# Altium schematic symbol library Regulator_Linear.SchLib: 1538 symbols (part 8 of 9) (continued)
## TLV75533PDBV
designator *  value TLV75533PDBV  Reference: U
ki_keywords: LDO Regulator Fixed Positive; ki_description: 500mA Low Dropout Voltage Regulator, Fixed Output 3.3V, SOT-23-5; ki_fp_filters: SOT?23*; Footprint: Package_TO_SOT_SMD:SOT-23-5; Datasheet: http://www.ti.com/lit/ds/symlink/tlv755p.pdf
pins: 1 IN, 2 GND, 3 EN, 4 NC hidden, 5 OUT

## TLV75533PDRV
designator *  value TLV75533PDRV  Reference: U
ki_keywords: LDO Regulator Fixed Positive; ki_description: 500mA Low Dropout Voltage Regulator, Fixed Output 3.3V, WSON6; ki_fp_filters: WSON*1EP*2x2mm*P0.65mm*; Footprint: Package_SON:WSON-6-1EP_2x2mm_P0.65mm_EP1x1.6mm; Datasheet: http://www.ti.com/lit/ds/symlink/tlv755p.pdf
pins: 1 OUT, 2 NC hidden, 3 GND, 4 EN, 5 NC hidden, 6 IN, 7 GND hidden

## TLV75709PDBV
designator *  value TLV75709PDBV  Reference: U
ki_keywords: LDO Regulator Fixed Positive; ki_description: 1A Low IQ Small Size Low Dropout Voltage Regulator, Fixed Output 0.9V, SOT-23-5; ki_fp_filters: SOT?23*; Footprint: Package_TO_SOT_SMD:SOT-23-5; Datasheet: https://www.ti.com/lit/ds/symlink/tlv757p.pdf
pins: 1 IN, 2 GND, 3 EN, 4 NC hidden, 5 OUT

## TLV75709PDRV
designator *  value TLV75709PDRV  Reference: U
ki_keywords: LDO Regulator Fixed Positive; ki_description: 1A Low IQ Small Size Low Dropout Voltage Regulator, Fixed Output 0.9V, WSON6; ki_fp_filters: WSON*1EP*2x2mm*P0.65mm*; Footprint: Package_SON:WSON-6-1EP_2x2mm_P0.65mm_EP1x1.6mm; Datasheet: https://www.ti.com/lit/ds/symlink/tlv757p.pdf
pins: 1 OUT, 2 NC hidden, 3 GND, 4 EN, 5 NC hidden, 6 IN, 7 GND hidden

## TLV75710PDBV
designator *  value TLV75710PDBV  Reference: U
ki_keywords: LDO Regulator Fixed Positive; ki_description: 1A Low IQ Small Size Low Dropout Voltage Regulator, Fixed Output 1.0V, SOT-23-5; ki_fp_filters: SOT?23*; Footprint: Package_TO_SOT_SMD:SOT-23-5; Datasheet: https://www.ti.com/lit/ds/symlink/tlv757p.pdf
pins: 1 IN, 2 GND, 3 EN, 4 NC hidden, 5 OUT

## TLV75710PDRV
designator *  value TLV75710PDRV  Reference: U
ki_keywords: LDO Regulator Fixed Positive; ki_description: 1A Low IQ Small Size Low Dropout Voltage Regulator, Fixed Output 1.0V, WSON6; ki_fp_filters: WSON*1EP*2x2mm*P0.65mm*; Footprint: Package_SON:WSON-6-1EP_2x2mm_P0.65mm_EP1x1.6mm; Datasheet: https://www.ti.com/lit/ds/symlink/tlv757p.pdf
pins: 1 OUT, 2 NC hidden, 3 GND, 4 EN, 5 NC hidden, 6 IN, 7 GND hidden

## TLV75712PDBV
designator *  value TLV75712PDBV  Reference: U
ki_keywords: LDO Regulator Fixed Positive; ki_description: 1A Low IQ Small Size Low Dropout Voltage Regulator, Fixed Output 1.2V, SOT-23-5; ki_fp_filters: SOT?23*; Footprint: Package_TO_SOT_SMD:SOT-23-5; Datasheet: https://www.ti.com/lit/ds/symlink/tlv757p.pdf
pins: 1 IN, 2 GND, 3 EN, 4 NC hidden, 5 OUT

## TLV75712PDRV
designator *  value TLV75712PDRV  Reference: U
ki_keywords: LDO Regulator Fixed Positive; ki_description: 1A Low IQ Small Size Low Dropout Voltage Regulator, Fixed Output 1.2V, WSON6; ki_fp_filters: WSON*1EP*2x2mm*P0.65mm*; Footprint: Package_SON:WSON-6-1EP_2x2mm_P0.65mm_EP1x1.6mm; Datasheet: https://www.ti.com/lit/ds/symlink/tlv757p.pdf
pins: 1 OUT, 2 NC hidden, 3 GND, 4 EN, 5 NC hidden, 6 IN, 7 GND hidden

## TLV75715PDBV
designator *  value TLV75715PDBV  Reference: U
ki_keywords: LDO Regulator Fixed Positive; ki_description: 1A Low IQ Small Size Low Dropout Voltage Regulator, Fixed Output 1.5V, SOT-23-5; ki_fp_filters: SOT?23*; Footprint: Package_TO_SOT_SMD:SOT-23-5; Datasheet: https://www.ti.com/lit/ds/symlink/tlv757p.pdf
pins: 1 IN, 2 GND, 3 EN, 4 NC hidden, 5 OUT

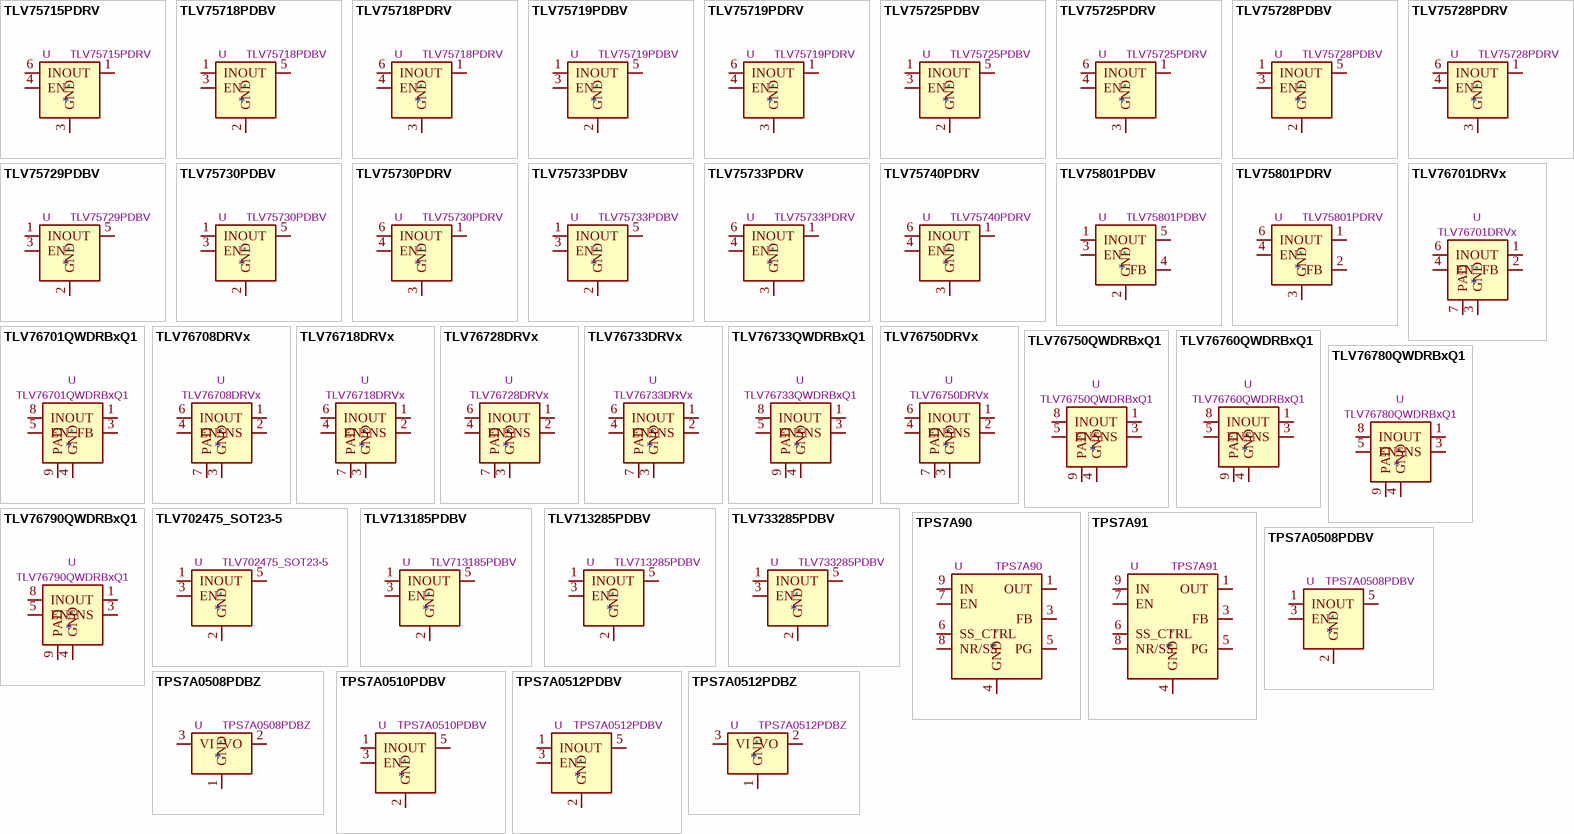
[diagram p34: symbols TLV75715PDRV to TPS7A0512PDBZ]

## TLV75715PDRV
designator *  value TLV75715PDRV  Reference: U
ki_keywords: LDO Regulator Fixed Positive; ki_description: 1A Low IQ Small Size Low Dropout Voltage Regulator, Fixed Output 1.5V, WSON6; ki_fp_filters: WSON*1EP*2x2mm*P0.65mm*; Footprint: Package_SON:WSON-6-1EP_2x2mm_P0.65mm_EP1x1.6mm; Datasheet: https://www.ti.com/lit/ds/symlink/tlv757p.pdf
pins: 1 OUT, 2 NC hidden, 3 GND, 4 EN, 5 NC hidden, 6 IN, 7 GND hidden

## TLV75718PDBV
designator *  value TLV75718PDBV  Reference: U
ki_keywords: LDO Regulator Fixed Positive; ki_description: 1A Low IQ Small Size Low Dropout Voltage Regulator, Fixed Output 1.8V, SOT-23-5; ki_fp_filters: SOT?23*; Footprint: Package_TO_SOT_SMD:SOT-23-5; Datasheet: https://www.ti.com/lit/ds/symlink/tlv757p.pdf
pins: 1 IN, 2 GND, 3 EN, 4 NC hidden, 5 OUT

## TLV75718PDRV
designator *  value TLV75718PDRV  Reference: U
ki_keywords: LDO Regulator Fixed Positive; ki_description: 1A Low IQ Small Size Low Dropout Voltage Regulator, Fixed Output 1.8V, WSON6; ki_fp_filters: WSON*1EP*2x2mm*P0.65mm*; Footprint: Package_SON:WSON-6-1EP_2x2mm_P0.65mm_EP1x1.6mm; Datasheet: https://www.ti.com/lit/ds/symlink/tlv757p.pdf
pins: 1 OUT, 2 NC hidden, 3 GND, 4 EN, 5 NC hidden, 6 IN, 7 GND hidden

## TLV75719PDBV
designator *  value TLV75719PDBV  Reference: U
ki_keywords: LDO Regulator Fixed Positive; ki_description: 1A Low IQ Small Size Low Dropout Voltage Regulator, Fixed Output 1.9V, SOT-23-5; ki_fp_filters: SOT?23*; Footprint: Package_TO_SOT_SMD:SOT-23-5; Datasheet: https://www.ti.com/lit/ds/symlink/tlv757p.pdf
pins: 1 IN, 2 GND, 3 EN, 4 NC hidden, 5 OUT

## TLV75719PDRV
designator *  value TLV75719PDRV  Reference: U
ki_keywords: LDO Regulator Fixed Positive; ki_description: 1A Low IQ Small Size Low Dropout Voltage Regulator, Fixed Output 1.9V, WSON6; ki_fp_filters: WSON*1EP*2x2mm*P0.65mm*; Footprint: Package_SON:WSON-6-1EP_2x2mm_P0.65mm_EP1x1.6mm; Datasheet: https://www.ti.com/lit/ds/symlink/tlv757p.pdf
pins: 1 OUT, 2 NC hidden, 3 GND, 4 EN, 5 NC hidden, 6 IN, 7 GND hidden

## TLV75725PDBV
designator *  value TLV75725PDBV  Reference: U
ki_keywords: LDO Regulator Fixed Positive; ki_description: 1A Low IQ Small Size Low Dropout Voltage Regulator, Fixed Output 2.5V, SOT-23-5; ki_fp_filters: SOT?23*; Footprint: Package_TO_SOT_SMD:SOT-23-5; Datasheet: https://www.ti.com/lit/ds/symlink/tlv757p.pdf
pins: 1 IN, 2 GND, 3 EN, 4 NC hidden, 5 OUT

## TLV75725PDRV
designator *  value TLV75725PDRV  Reference: U
ki_keywords: LDO Regulator Fixed Positive; ki_description: 1A Low IQ Small Size Low Dropout Voltage Regulator, Fixed Output 2.5V, WSON6; ki_fp_filters: WSON*1EP*2x2mm*P0.65mm*; Footprint: Package_SON:WSON-6-1EP_2x2mm_P0.65mm_EP1x1.6mm; Datasheet: https://www.ti.com/lit/ds/symlink/tlv757p.pdf
pins: 1 OUT, 2 NC hidden, 3 GND, 4 EN, 5 NC hidden, 6 IN, 7 GND hidden

## TLV75728PDBV
designator *  value TLV75728PDBV  Reference: U
ki_keywords: LDO Regulator Fixed Positive; ki_description: 1A Low IQ Small Size Low Dropout Voltage Regulator, Fixed Output 2.8V, SOT-23-5; ki_fp_filters: SOT?23*; Footprint: Package_TO_SOT_SMD:SOT-23-5; Datasheet: https://www.ti.com/lit/ds/symlink/tlv757p.pdf
pins: 1 IN, 2 GND, 3 EN, 4 NC hidden, 5 OUT

## TLV75728PDRV
designator *  value TLV75728PDRV  Reference: U
ki_keywords: LDO Regulator Fixed Positive; ki_description: 1A Low IQ Small Size Low Dropout Voltage Regulator, Fixed Output 2.8V, WSON6; ki_fp_filters: WSON*1EP*2x2mm*P0.65mm*; Footprint: Package_SON:WSON-6-1EP_2x2mm_P0.65mm_EP1x1.6mm; Datasheet: https://www.ti.com/lit/ds/symlink/tlv757p.pdf
pins: 1 OUT, 2 NC hidden, 3 GND, 4 EN, 5 NC hidden, 6 IN, 7 GND hidden

## TLV75729PDBV
designator *  value TLV75729PDBV  Reference: U
ki_keywords: LDO Regulator Fixed Positive; ki_description: 1A Low IQ Small Size Low Dropout Voltage Regulator, Fixed Output 2.9V, SOT-23-5; ki_fp_filters: SOT?23*; Footprint: Package_TO_SOT_SMD:SOT-23-5; Datasheet: https://www.ti.com/lit/ds/symlink/tlv757p.pdf
pins: 1 IN, 2 GND, 3 EN, 4 NC hidden, 5 OUT

## TLV75730PDBV
designator *  value TLV75730PDBV  Reference: U
ki_keywords: LDO Regulator Fixed Positive; ki_description: 1A Low IQ Small Size Low Dropout Voltage Regulator, Fixed Output 3.0V, SOT-23-5; ki_fp_filters: SOT?23*; Footprint: Package_TO_SOT_SMD:SOT-23-5; Datasheet: https://www.ti.com/lit/ds/symlink/tlv757p.pdf
pins: 1 IN, 2 GND, 3 EN, 4 NC hidden, 5 OUT

## TLV75730PDRV
designator *  value TLV75730PDRV  Reference: U
ki_keywords: LDO Regulator Fixed Positive; ki_description: 1A Low IQ Small Size Low Dropout Voltage Regulator, Fixed Output 3.0V, WSON6; ki_fp_filters: WSON*1EP*2x2mm*P0.65mm*; Footprint: Package_SON:WSON-6-1EP_2x2mm_P0.65mm_EP1x1.6mm; Datasheet: https://www.ti.com/lit/ds/symlink/tlv757p.pdf
pins: 1 OUT, 2 NC hidden, 3 GND, 4 EN, 5 NC hidden, 6 IN, 7 GND hidden

## TLV75733PDBV
designator *  value TLV75733PDBV  Reference: U
ki_keywords: LDO Regulator Fixed Positive; ki_description: 1A Low IQ Small Size Low Dropout Voltage Regulator, Fixed Output 3.3V, SOT-23-5; ki_fp_filters: SOT?23*; Footprint: Package_TO_SOT_SMD:SOT-23-5; Datasheet: https://www.ti.com/lit/ds/symlink/tlv757p.pdf
pins: 1 IN, 2 GND, 3 EN, 4 NC hidden, 5 OUT

## TLV75733PDRV
designator *  value TLV75733PDRV  Reference: U
ki_keywords: LDO Regulator Fixed Positive; ki_description: 1A Low IQ Small Size Low Dropout Voltage Regulator, Fixed Output 3.3V, WSON6; ki_fp_filters: WSON*1EP*2x2mm*P0.65mm*; Footprint: Package_SON:WSON-6-1EP_2x2mm_P0.65mm_EP1x1.6mm; Datasheet: https://www.ti.com/lit/ds/symlink/tlv757p.pdf
pins: 1 OUT, 2 NC hidden, 3 GND, 4 EN, 5 NC hidden, 6 IN, 7 GND hidden

## TLV75740PDRV
designator *  value TLV75740PDRV  Reference: U
ki_keywords: LDO Regulator Fixed Positive; ki_description: 1A Low IQ Small Size Low Dropout Voltage Regulator, Fixed Output 4.0V, WSON6; ki_fp_filters: WSON*1EP*2x2mm*P0.65mm*; Footprint: Package_SON:WSON-6-1EP_2x2mm_P0.65mm_EP1x1.6mm; Datasheet: https://www.ti.com/lit/ds/symlink/tlv757p.pdf
pins: 1 OUT, 2 NC hidden, 3 GND, 4 EN, 5 NC hidden, 6 IN, 7 GND hidden

## TLV75801PDBV
designator *  value TLV75801PDBV  Reference: U
ki_keywords: ldo positive; ki_description: 500mA Low-Dropout Linear Regulator, Adjustable Output, SOT-23-5; ki_fp_filters: SOT?23*; Footprint: Package_TO_SOT_SMD:SOT-23-5; Datasheet: https://www.ti.com/lit/ds/symlink/tlv758p.pdf
pins: 1 IN, 2 GND, 3 EN, 4 FB, 5 OUT

## TLV75801PDRV
designator *  value TLV75801PDRV  Reference: U
ki_keywords: ldo positive; ki_description: 500mA Low-Dropout Linear Regulator, Adjustable Output, WSON-6; ki_fp_filters: WSON*1EP*2x2mm*P0.65mm*; Footprint: Package_SON:WSON-6-1EP_2x2mm_P0.65mm_EP1x1.6mm; Datasheet: https://www.ti.com/lit/ds/symlink/tlv758p.pdf
pins: 1 OUT, 2 FB, 3 GND, 4 EN, 5 DNC hidden, 6 IN, 7 GND hidden

## TLV76701DRVx
designator *  value TLV76701DRVx  Reference: U
ki_keywords: 1A, 16V Precision Linear Voltage Regulator; ki_description: 1A, 16V Precision Linear Voltage Regulator, with enable pin, Adjustable Output 0.8-13.6V, WSON-6; ki_fp_filters: WSON*1EP*2x2mm*P0.65*; Footprint: Package_SON:WSON-6-1EP_2x2mm_P0.65mm_EP1x1.6mm_ThermalVias; Datasheet: www.ti.com/lit/gpn/TLV767
pins: 1 OUT, 2 FB, 3 GND, 4 EN, 5 GND hidden, 6 IN, 7 PAD

## TLV76701QWDRBxQ1
designator *  value TLV76701QWDRBxQ1  Reference: U
ki_keywords: 1A 16V Precision Linear Voltage Regulator; ki_description: 1A, 16V Precision Linear Voltage Regulator, with enable pin, Adjustable Output 0.8-14.6V, VSON-8; ki_fp_filters: VSON*1EP*3x3mm*P0.65mm*; Footprint: Package_SON:VSON-8-1EP_3x3mm_P0.65mm_EP1.65x2.4mm; Datasheet: www.ti.com/lit/gpn/TLV767-q1
pins: 1 OUT, 2 NC hidden, 3 FB, 4 GND, 5 EN, 6 GND hidden, 7 NC hidden, 8 IN, 9 PAD

## TLV76708DRVx
designator *  value TLV76708DRVx  Reference: U
ki_keywords: 1A Precision Linear Voltage Regulator; ki_description: 1A Precision Linear Voltage Regulator, with enable pin, Fixed Output 0.8V, WSON6; ki_fp_filters: WSON*1EP*2x2mm*P0.65*; Footprint: Package_SON:WSON-6-1EP_2x2mm_P0.65mm_EP1x1.6mm_ThermalVias; Datasheet: www.ti.com/lit/gpn/TLV767
pins: 1 OUT, 2 SNS, 3 GND, 4 EN, 5 GND hidden, 6 IN, 7 PAD

## TLV76718DRVx
designator *  value TLV76718DRVx  Reference: U
ki_keywords: 1A Precision Linear Voltage Regulator; ki_description: 1A Precision Linear Voltage Regulator, with enable pin, Fixed Output 1.8V, WSON6; ki_fp_filters: WSON*1EP*2x2mm*P0.65*; Footprint: Package_SON:WSON-6-1EP_2x2mm_P0.65mm_EP1x1.6mm_ThermalVias; Datasheet: www.ti.com/lit/gpn/TLV767
pins: 1 OUT, 2 SNS, 3 GND, 4 EN, 5 GND hidden, 6 IN, 7 PAD

## TLV76728DRVx
designator *  value TLV76728DRVx  Reference: U
ki_keywords: 1A Precision Linear Voltage Regulator; ki_description: 1A Precision Linear Voltage Regulator, with enable pin, Fixed Output 2.8V, WSON6; ki_fp_filters: WSON*1EP*2x2mm*P0.65*; Footprint: Package_SON:WSON-6-1EP_2x2mm_P0.65mm_EP1x1.6mm_ThermalVias; Datasheet: www.ti.com/lit/gpn/TLV767
pins: 1 OUT, 2 SNS, 3 GND, 4 EN, 5 GND hidden, 6 IN, 7 PAD

## TLV76733DRVx
designator *  value TLV76733DRVx  Reference: U
ki_keywords: 1A Precision Linear Voltage Regulator; ki_description: 1A Precision Linear Voltage Regulator, with enable pin, Fixed Output 3.3V, WSON6; ki_fp_filters: WSON*1EP*2x2mm*P0.65*; Footprint: Package_SON:WSON-6-1EP_2x2mm_P0.65mm_EP1x1.6mm_ThermalVias; Datasheet: www.ti.com/lit/gpn/TLV767
pins: 1 OUT, 2 SNS, 3 GND, 4 EN, 5 GND hidden, 6 IN, 7 PAD

## TLV76733QWDRBxQ1
designator *  value TLV76733QWDRBxQ1  Reference: U
ki_keywords: 1A 16V Precision Linear Voltage Regulator; ki_description: 1A, 16V Precision Linear Voltage Regulator, with enable pin, Fixed Output 3.3V, VSON-8; ki_fp_filters: VSON*1EP*3x3mm*P0.65mm*; Footprint: Package_SON:VSON-8-1EP_3x3mm_P0.65mm_EP1.65x2.4mm; Datasheet: www.ti.com/lit/gpn/TLV767-q1
pins: 1 OUT, 2 NC hidden, 3 SNS, 4 GND, 5 EN, 6 GND hidden, 7 NC hidden, 8 IN, 9 PAD

## TLV76750DRVx
designator *  value TLV76750DRVx  Reference: U
ki_keywords: 1A, 16V Precision Linear Voltage Regulator; ki_description: 1A, 16V Precision Linear Voltage Regulator, with enable pin, Fixed Output 5.0V, WSON-6; ki_fp_filters: WSON*1EP*2x2mm*P0.65*; Footprint: Package_SON:WSON-6-1EP_2x2mm_P0.65mm_EP1x1.6mm_ThermalVias; Datasheet: www.ti.com/lit/gpn/TLV767
pins: 1 OUT, 2 SNS, 3 GND, 4 EN, 5 GND hidden, 6 IN, 7 PAD

## TLV76750QWDRBxQ1
designator *  value TLV76750QWDRBxQ1  Reference: U
ki_keywords: 1A 16V Precision Linear Voltage Regulator; ki_description: 1A, 16V Precision Linear Voltage Regulator, with enable pin, Fixed Output 5.0V, VSON-8; ki_fp_filters: VSON*1EP*3x3mm*P0.65mm*; Footprint: Package_SON:VSON-8-1EP_3x3mm_P0.65mm_EP1.65x2.4mm; Datasheet: www.ti.com/lit/gpn/TLV767-q1
pins: 1 OUT, 2 NC hidden, 3 SNS, 4 GND, 5 EN, 6 GND hidden, 7 NC hidden, 8 IN, 9 PAD

## TLV76760QWDRBxQ1
designator *  value TLV76760QWDRBxQ1  Reference: U
ki_keywords: 1A 16V Precision Linear Voltage Regulator; ki_description: 1A, 16V Precision Linear Voltage Regulator, with enable pin, Fixed Output 6.0V, VSON-8; ki_fp_filters: VSON*1EP*3x3mm*P0.65mm*; Footprint: Package_SON:VSON-8-1EP_3x3mm_P0.65mm_EP1.65x2.4mm; Datasheet: www.ti.com/lit/gpn/TLV767-q1
pins: 1 OUT, 2 NC hidden, 3 SNS, 4 GND, 5 EN, 6 GND hidden, 7 NC hidden, 8 IN, 9 PAD

## TLV76780QWDRBxQ1
designator *  value TLV76780QWDRBxQ1  Reference: U
ki_keywords: 1A 16V Precision Linear Voltage Regulator; ki_description: 1A, 16V Precision Linear Voltage Regulator, with enable pin, Fixed Output 8.0V, VSON-8; ki_fp_filters: VSON*1EP*3x3mm*P0.65mm*; Footprint: Package_SON:VSON-8-1EP_3x3mm_P0.65mm_EP1.65x2.4mm; Datasheet: www.ti.com/lit/gpn/TLV767-q1
pins: 1 OUT, 2 NC hidden, 3 SNS, 4 GND, 5 EN, 6 GND hidden, 7 NC hidden, 8 IN, 9 PAD

## TLV76790QWDRBxQ1
designator *  value TLV76790QWDRBxQ1  Reference: U
ki_keywords: 1A 16V Precision Linear Voltage Regulator; ki_description: 1A, 16V Precision Linear Voltage Regulator, with enable pin, Fixed Output 9.0V, VSON-8; ki_fp_filters: VSON*1EP*3x3mm*P0.65mm*; Footprint: Package_SON:VSON-8-1EP_3x3mm_P0.65mm_EP1.65x2.4mm; Datasheet: www.ti.com/lit/gpn/TLV767-q1
pins: 1 OUT, 2 NC hidden, 3 SNS, 4 GND, 5 EN, 6 GND hidden, 7 NC hidden, 8 IN, 9 PAD

## TLV702475_SOT23-5
designator *  value TLV702475_SOT23-5  Reference: U
ki_keywords: 300mA LDO Regulator Fixed Positive; ki_description: 300mA Low Dropout Voltage Regulator, Fixed Output 4.75V, SOT-23-5; ki_fp_filters: SOT?23*; Footprint: Package_TO_SOT_SMD:SOT-23-5; Datasheet: http://www.ti.com/lit/ds/symlink/tlv702.pdf
pins: 1 IN, 2 GND, 3 EN, 4 NC hidden, 5 OUT

## TLV713185PDBV
designator *  value TLV713185PDBV  Reference: U
ki_keywords: LDO Regulator Fixed Positive; ki_description: 150mA Low Dropout Voltage Regulator, Fixed Output 1.8V, SOT-23-5; ki_fp_filters: SOT?23*; Footprint: Package_TO_SOT_SMD:SOT-23-5; Datasheet: http://www.ti.com/lit/ds/symlink/tlv713p.pdf
pins: 1 IN, 2 GND, 3 EN, 4 NC hidden, 5 OUT

## TLV713285PDBV
designator *  value TLV713285PDBV  Reference: U
ki_keywords: LDO Regulator Fixed Positive; ki_description: 150mA Low Dropout Voltage Regulator, Fixed Output 2.85V, SOT-23-5; ki_fp_filters: SOT?23*; Footprint: Package_TO_SOT_SMD:SOT-23-5; Datasheet: http://www.ti.com/lit/ds/symlink/tlv713p.pdf
pins: 1 IN, 2 GND, 3 EN, 4 NC hidden, 5 OUT

## TLV733285PDBV
designator *  value TLV733285PDBV  Reference: U
ki_keywords: 300mA LDO Regulator Fixed Positive Capacitor-Free; ki_description: 300mA Capacitor-Free Low Dropout Voltage Regulator, Fixed Output 2.85V, SOT-23-5; ki_fp_filters: SOT?23*; Footprint: Package_TO_SOT_SMD:SOT-23-5; Datasheet: http://www.ti.com/lit/ds/symlink/tlv733p.pdf
pins: 1 IN, 2 GND, 3 EN, 4 NC hidden, 5 OUT

## TPS7A90
designator *  value TPS7A90  Reference: U
ki_keywords: LDO voltage regulator; ki_description: 0.5A, High-Accuracy, Low-Noise LDO Voltage Regulator, Texas S-PDSO-N10; ki_fp_filters: Texas*S*PDSO*; Footprint: Package_DFN_QFN:Texas_S-PDSO-N10_EP1.2x2mm; Datasheet: http://www.ti.com/lit/ds/symlink/tps7a90.pdf
pins: 1 OUT, 2 OUT hidden, 3 FB, 4 GND, 5 PG, 6 SS_CTRL, 7 EN, 8 NR/SS, 9 IN, 10 IN hidden, 11 GND hidden

## TPS7A91
designator *  value TPS7A91  Reference: U
ki_keywords: LDO voltage regulator; ki_description: 1A, High-Accuracy, Low-Noise LDO Voltage Regulator, Texas S-PDSO-N10; ki_fp_filters: Texas*S*PDSO*; Footprint: Package_DFN_QFN:Texas_S-PDSO-N10_EP1.2x2mm; Datasheet: http://www.ti.com/lit/ds/symlink/tps7a91.pdf
pins: 1 OUT, 2 OUT hidden, 3 FB, 4 GND, 5 PG, 6 SS_CTRL, 7 EN, 8 NR/SS, 9 IN, 10 IN hidden, 11 GND hidden

## TPS7A0508PDBV
designator *  value TPS7A0508PDBV  Reference: U
ki_keywords: Single Output LDO Low-Iq; ki_description: 200-mA Ultra-Low-Iq LDO, 0.8V, SOT-23-5; ki_fp_filters: SOT?23*; Footprint: Package_TO_SOT_SMD:SOT-23-5; Datasheet: https://www.ti.com/lit/ds/symlink/tps7a05.pdf
pins: 1 IN, 2 GND, 3 EN, 4 NC hidden, 5 OUT

## TPS7A0508PDBZ
designator *  value TPS7A0508PDBZ  Reference: U
ki_keywords: Single Output LDO Low-Iq; ki_description: 200-mA Ultra-Low-Iq LDO, 0.8V, SOT-23-3; ki_fp_filters: SOT?23*; Footprint: Package_TO_SOT_SMD:SOT-23; Datasheet: https://www.ti.com/lit/ds/symlink/tps7a05.pdf
pins: 1 GND, 2 VO, 3 VI

## TPS7A0510PDBV
designator *  value TPS7A0510PDBV  Reference: U
ki_keywords: Single Output LDO Low-Iq; ki_description: 200-mA Ultra-Low-Iq LDO, 1.0V, SOT-23-5; ki_fp_filters: SOT?23*; Footprint: Package_TO_SOT_SMD:SOT-23-5; Datasheet: https://www.ti.com/lit/ds/symlink/tps7a05.pdf
pins: 1 IN, 2 GND, 3 EN, 4 NC hidden, 5 OUT

## TPS7A0512PDBV
designator *  value TPS7A0512PDBV  Reference: U
ki_keywords: Single Output LDO Low-Iq; ki_description: 200-mA Ultra-Low-Iq LDO, 1.2V, SOT-23-5; ki_fp_filters: SOT?23*; Footprint: Package_TO_SOT_SMD:SOT-23-5; Datasheet: https://www.ti.com/lit/ds/symlink/tps7a05.pdf
pins: 1 IN, 2 GND, 3 EN, 4 NC hidden, 5 OUT

## TPS7A0512PDBZ
designator *  value TPS7A0512PDBZ  Reference: U
ki_keywords: Single Output LDO Low-Iq; ki_description: 200-mA Ultra-Low-Iq LDO, 1.2V, SOT-23-3; ki_fp_filters: SOT?23*; Footprint: Package_TO_SOT_SMD:SOT-23; Datasheet: https://www.ti.com/lit/ds/symlink/tps7a05.pdf
pins: 1 GND, 2 VO, 3 VI

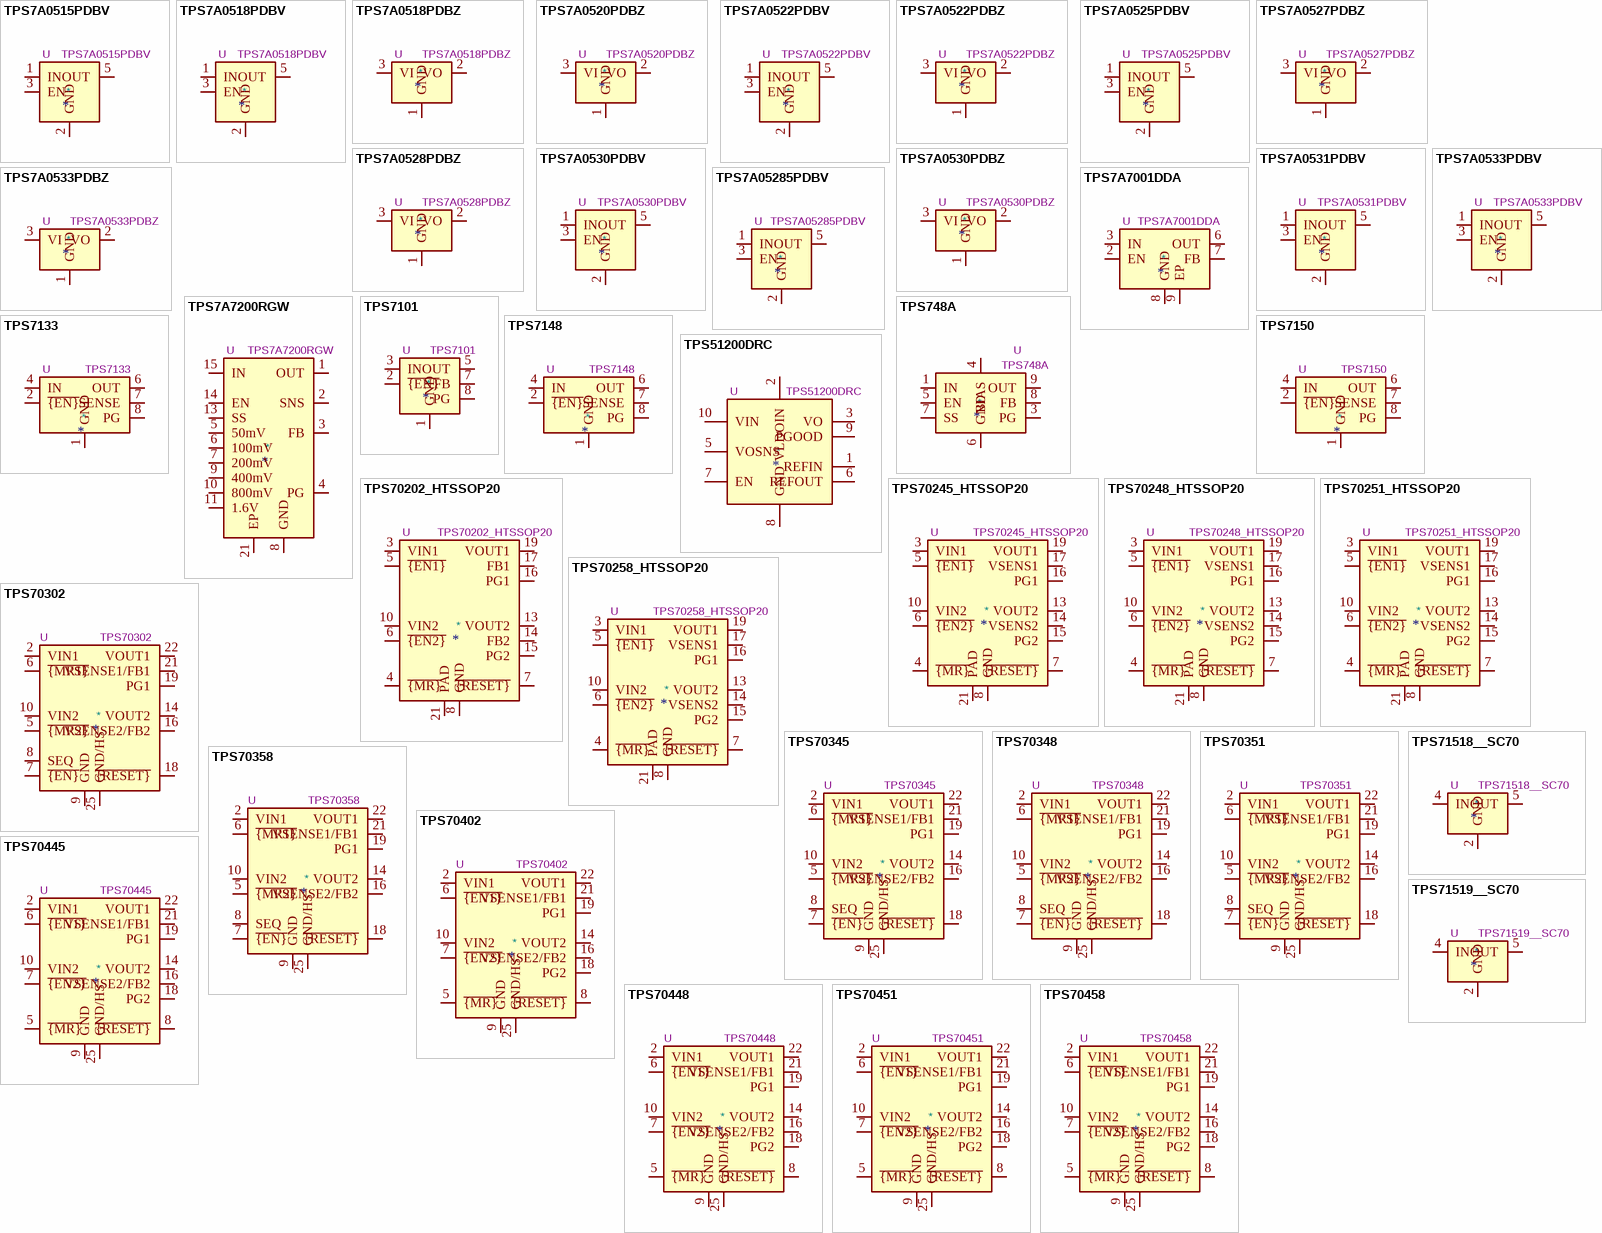
[diagram p35: symbols TPS7A0515PDBV to TPS71519__SC70]

## TPS7A0515PDBV
designator *  value TPS7A0515PDBV  Reference: U
ki_keywords: Single Output LDO Low-Iq; ki_description: 200-mA Ultra-Low-Iq LDO, 1.5V, SOT-23-5; ki_fp_filters: SOT?23*; Footprint: Package_TO_SOT_SMD:SOT-23-5; Datasheet: https://www.ti.com/lit/ds/symlink/tps7a05.pdf
pins: 1 IN, 2 GND, 3 EN, 4 NC hidden, 5 OUT

## TPS7A0518PDBV
designator *  value TPS7A0518PDBV  Reference: U
ki_keywords: Single Output LDO Low-Iq; ki_description: 200-mA Ultra-Low-Iq LDO, 1.8V, SOT-23-5; ki_fp_filters: SOT?23*; Footprint: Package_TO_SOT_SMD:SOT-23-5; Datasheet: https://www.ti.com/lit/ds/symlink/tps7a05.pdf
pins: 1 IN, 2 GND, 3 EN, 4 NC hidden, 5 OUT

## TPS7A0518PDBZ
designator *  value TPS7A0518PDBZ  Reference: U
ki_keywords: Single Output LDO Low-Iq; ki_description: 200-mA Ultra-Low-Iq LDO, 1.8V, SOT-23-3; ki_fp_filters: SOT?23*; Footprint: Package_TO_SOT_SMD:SOT-23; Datasheet: https://www.ti.com/lit/ds/symlink/tps7a05.pdf
pins: 1 GND, 2 VO, 3 VI

## TPS7A0520PDBZ
designator *  value TPS7A0520PDBZ  Reference: U
ki_keywords: Single Output LDO Low-Iq; ki_description: 200-mA Ultra-Low-Iq LDO, 2.0V, SOT-23-3; ki_fp_filters: SOT?23*; Footprint: Package_TO_SOT_SMD:SOT-23; Datasheet: https://www.ti.com/lit/ds/symlink/tps7a05.pdf
pins: 1 GND, 2 VO, 3 VI

## TPS7A0522PDBV
designator *  value TPS7A0522PDBV  Reference: U
ki_keywords: Single Output LDO Low-Iq; ki_description: 200-mA Ultra-Low-Iq LDO, 2.2V, SOT-23-5; ki_fp_filters: SOT?23*; Footprint: Package_TO_SOT_SMD:SOT-23-5; Datasheet: https://www.ti.com/lit/ds/symlink/tps7a05.pdf
pins: 1 IN, 2 GND, 3 EN, 4 NC hidden, 5 OUT

## TPS7A0522PDBZ
designator *  value TPS7A0522PDBZ  Reference: U
ki_keywords: Single Output LDO Low-Iq; ki_description: 200-mA Ultra-Low-Iq LDO, 2.2V, SOT-23-3; ki_fp_filters: SOT?23*; Footprint: Package_TO_SOT_SMD:SOT-23; Datasheet: https://www.ti.com/lit/ds/symlink/tps7a05.pdf
pins: 1 GND, 2 VO, 3 VI

## TPS7A0525PDBV
designator *  value TPS7A0525PDBV  Reference: U
ki_keywords: Single Output LDO Low-Iq; ki_description: 200-mA Ultra-Low-Iq LDO, 2.5V, SOT-23-5; ki_fp_filters: SOT?23*; Footprint: Package_TO_SOT_SMD:SOT-23-5; Datasheet: https://www.ti.com/lit/ds/symlink/tps7a05.pdf
pins: 1 IN, 2 GND, 3 EN, 4 NC hidden, 5 OUT

## TPS7A0527PDBZ
designator *  value TPS7A0527PDBZ  Reference: U
ki_keywords: Single Output LDO Low-Iq; ki_description: 200-mA Ultra-Low-Iq LDO, 2.7V, SOT-23-3; ki_fp_filters: SOT?23*; Footprint: Package_TO_SOT_SMD:SOT-23; Datasheet: https://www.ti.com/lit/ds/symlink/tps7a05.pdf
pins: 1 GND, 2 VO, 3 VI

## TPS7A0528PDBZ
designator *  value TPS7A0528PDBZ  Reference: U
ki_keywords: Single Output LDO Low-Iq; ki_description: 200-mA Ultra-Low-Iq LDO, 2.8V, SOT-23-3; ki_fp_filters: SOT?23*; Footprint: Package_TO_SOT_SMD:SOT-23; Datasheet: https://www.ti.com/lit/ds/symlink/tps7a05.pdf
pins: 1 GND, 2 VO, 3 VI

## TPS7A0530PDBV
designator *  value TPS7A0530PDBV  Reference: U
ki_keywords: Single Output LDO Low-Iq; ki_description: 200-mA Ultra-Low-Iq LDO, 3.0V, SOT-23-5; ki_fp_filters: SOT?23*; Footprint: Package_TO_SOT_SMD:SOT-23-5; Datasheet: https://www.ti.com/lit/ds/symlink/tps7a05.pdf
pins: 1 IN, 2 GND, 3 EN, 4 NC hidden, 5 OUT

## TPS7A0530PDBZ
designator *  value TPS7A0530PDBZ  Reference: U
ki_keywords: Single Output LDO Low-Iq; ki_description: 200-mA Ultra-Low-Iq LDO, 3.0V, SOT-23-3; ki_fp_filters: SOT?23*; Footprint: Package_TO_SOT_SMD:SOT-23; Datasheet: https://www.ti.com/lit/ds/symlink/tps7a05.pdf
pins: 1 GND, 2 VO, 3 VI

## TPS7A0531PDBV
designator *  value TPS7A0531PDBV  Reference: U
ki_keywords: Single Output LDO Low-Iq; ki_description: 200-mA Ultra-Low-Iq LDO, 3.1V, SOT-23-5; ki_fp_filters: SOT?23*; Footprint: Package_TO_SOT_SMD:SOT-23-5; Datasheet: https://www.ti.com/lit/ds/symlink/tps7a05.pdf
pins: 1 IN, 2 GND, 3 EN, 4 NC hidden, 5 OUT

## TPS7A0533PDBV
designator *  value TPS7A0533PDBV  Reference: U
ki_keywords: Single Output LDO Low-Iq; ki_description: 200-mA Ultra-Low-Iq LDO, 3.3V, SOT-23-5; ki_fp_filters: SOT?23*; Footprint: Package_TO_SOT_SMD:SOT-23-5; Datasheet: https://www.ti.com/lit/ds/symlink/tps7a05.pdf
pins: 1 IN, 2 GND, 3 EN, 4 NC hidden, 5 OUT

## TPS7A0533PDBZ
designator *  value TPS7A0533PDBZ  Reference: U
ki_keywords: Single Output LDO Low-Iq; ki_description: 200-mA Ultra-Low-Iq LDO, 3.3V, SOT-23-3; ki_fp_filters: SOT?23*; Footprint: Package_TO_SOT_SMD:SOT-23; Datasheet: https://www.ti.com/lit/ds/symlink/tps7a05.pdf
pins: 1 GND, 2 VO, 3 VI

## TPS7A05285PDBV
designator *  value TPS7A05285PDBV  Reference: U
ki_keywords: Single Output LDO Low-Iq; ki_description: 200-mA Ultra-Low-Iq LDO, 2.85V, SOT-23-5; ki_fp_filters: SOT?23*; Footprint: Package_TO_SOT_SMD:SOT-23-5; Datasheet: https://www.ti.com/lit/ds/symlink/tps7a05.pdf
pins: 1 IN, 2 GND, 3 EN, 4 NC hidden, 5 OUT

## TPS7A7001DDA
designator *  value TPS7A7001DDA  Reference: U
ki_keywords: ldo regulator voltage linear; ki_description: 2A, Low-Dropout Voltage Regulator, 1.425-6.5V Input, Adjustable Min 0.5V Output, PowerPad SO-8; ki_fp_filters: TI*SO*PowerPAD*; Footprint: Package_SO:TI_SO-PowerPAD-8; Datasheet: http://www.ti.com/lit/ds/symlink/tps7a7001.pdf
pins: 1 NC hidden, 2 EN, 3 IN, 4 NC hidden, 5 NC hidden, 6 OUT, 7 FB, 8 GND, 9 EP

## TPS7A7200RGW
designator *  value TPS7A7200RGW  Reference: U
ki_keywords: linear regulator ldo voltage; ki_description: 2A, Low-Dropout Voltage Regulator, 1.5-6.5V Input, Adjustable 0.9-5V Output, VQFN-20; ki_fp_filters: Texas*S?PVQFN*; Footprint: Package_DFN_QFN:Texas_S-PVQFN-N20_EP3.15x3.15mm_ThermalVias; Datasheet: http://www.ti.com/lit/ds/symlink/tps7a7200.pdf
pins: 1 OUT, 2 SNS, 3 FB, 4 PG, 5 50mV, 6 100mV, 7 200mV, 8 GND, 9 400mV, 10 800mV, 11 1.6V, 12 NC hidden, 13 SS, 14 EN, 15 IN, 16 IN hidden, 17 IN hidden, 18 GND hidden, 19 OUT hidden, 20 OUT hidden, 21 EP

## TPS748A
designator *  value TPS748A  Reference: U
ki_keywords: regulator LDO positive adjustable; ki_description: Texas Instruments 1.5A, Low-Dropout Linear Regulator With Programmable Soft-Start, 0.8-6.0Vin, 2.7-6.0Vbias, 0.8-3.6Vout; ki_fp_filters: VSON*EP*3x3mm*P0.5mm*; Footprint: Package_SON:VSON-10-1EP_3x3mm_P0.5mm_EP1.65x2.4mm_ThermalVias; Datasheet: https://www.ti.com/lit/ds/symlink/tps748a.pdf
pins: 1 IN, 2 IN hidden, 3 PG, 4 BIAS, 5 EN, 6 GND, 7 SS, 8 FB, 9 OUT, 10 OUT hidden, 11 GND hidden

## TPS7101
designator *  value TPS7101  Reference: U
ki_keywords: LDO Voltage Regulator 500mA Adjustable; ki_description: 500mA Adjustable 1.2-9.75V Low Drop-out Voltage Regulator, SO-8/DIP-8; ki_fp_filters: SOIC*3.9x4.9mm*P1.27mm* DIP*W7.62mm*; Datasheet: http://www.ti.com/lit/ds/symlink/tps71.pdf
pins: 1 GND, 2 ~{{EN}}, 3 IN, 4 IN hidden, 5 OUT, 6 OUT hidden, 7 FB, 8 PG

## TPS7133
designator *  value TPS7133  Reference: U
ki_keywords: LDO Voltage Regulator 500mA; ki_description: 500mA Low Drop-out Voltage Regulator, Fixed Output 3.3V, SO-8/DIP-8; ki_fp_filters: SOIC*3.9x4.9mm*P1.27mm* DIP*W7.62mm*; Datasheet: http://www.ti.com/lit/ds/symlink/tps71.pdf
pins: 1 GND, 2 ~{{EN}}, 3 IN hidden, 4 IN, 5 OUT hidden, 6 OUT, 7 SENSE, 8 PG

## TPS7148
designator *  value TPS7148  Reference: U
ki_keywords: LDO Voltage Regulator 500mA; ki_description: 500mA Low Drop-out Voltage Regulator, Fixed Output 4.85V, SO-8/DIP-8; ki_fp_filters: SOIC*3.9x4.9mm*P1.27mm* DIP*W7.62mm*; Datasheet: http://www.ti.com/lit/ds/symlink/tps71.pdf
pins: 1 GND, 2 ~{{EN}}, 3 IN hidden, 4 IN, 5 OUT hidden, 6 OUT, 7 SENSE, 8 PG

## TPS7150
designator *  value TPS7150  Reference: U
ki_keywords: LDO Voltage Regulator 500mA; ki_description: 500mA Low Drop-out Voltage Regulator, Fixed Output 5V, SO-8/DIP-8; ki_fp_filters: SOIC*3.9x4.9mm*P1.27mm* DIP*W7.62mm*; Datasheet: http://www.ti.com/lit/ds/symlink/tps71.pdf
pins: 1 GND, 2 ~{{EN}}, 3 IN hidden, 4 IN, 5 OUT hidden, 6 OUT, 7 SENSE, 8 PG

## TPS51200DRC
designator *  value TPS51200DRC  Reference: U
ki_keywords: DDR LDO; ki_description: Sink and Source DDR Termination Regulator, VSON-10; ki_fp_filters: *VSON?10?1EP?3x3mm?P0.5mm*; Footprint: Package_SON:VSON-10-1EP_3x3mm_P0.5mm_EP1.65x2.4mm; Datasheet: http://www.ti.com/lit/ds/symlink/tps51200.pdf
pins: 1 REFIN, 2 VLDOIN, 3 VO, 4 GND hidden, 5 VOSNS, 6 REFOUT, 7 EN, 8 GND, 9 PGOOD, 10 VIN, 11 GND hidden

## TPS70202_HTSSOP20
designator *  value TPS70202_HTSSOP20  Reference: U
ki_keywords: Dual LDO Adjustable Regulator 500mA 250mA Voltage Supervisor; ki_description: 500mA/250mA Dual Adjustable Low Drop-out Regulator with Voltage Supervisor, PowerPAD TSSOP-20; ki_fp_filters: HTSSOP*4.4x6.5mm*P0.65mm*; Footprint: Package_SO:HTSSOP-20-1EP_4.4x6.5mm_P0.65mm_EP3.4x6.5mm_ThermalVias; Datasheet: http://www.ti.com/lit/ds/symlink/tps702.pdf
pins: 1 NC hidden, 2 VIN1 hidden, 3 VIN1, 4 ~{{MR}}, 5 ~{{EN1}}, 6 ~{{EN2}}, 7 ~{{RESET}}, 8 GND, 9 VIN2 hidden, 10 VIN2, 11 NC hidden, 12 VOUT2 hidden, 13 VOUT2, 14 FB2, 15 PG2, 16 PG1, 17 FB1, 18 VOUT1 hidden, 19 VOUT1, 20 NC hidden, 21 PAD

## TPS70245_HTSSOP20
designator *  value TPS70245_HTSSOP20  Reference: U
ki_keywords: Dual 3.3V 1.2V LDO Regulator 500mA 250mA Voltage Supervisor; ki_description: 3.3V 500mA/1.2V 250mA Dual Low Drop-out Regulator with Voltage Supervisor, PowerPAD TSSOP-20; ki_fp_filters: HTSSOP*4.4x6.5mm*P0.65mm*; Footprint: Package_SO:HTSSOP-20-1EP_4.4x6.5mm_P0.65mm_EP3.4x6.5mm_ThermalVias; Datasheet: http://www.ti.com/lit/ds/symlink/tps702.pdf
pins: 1 NC hidden, 2 VIN1 hidden, 3 VIN1, 4 ~{{MR}}, 5 ~{{EN1}}, 6 ~{{EN2}}, 7 ~{{RESET}}, 8 GND, 9 VIN2 hidden, 10 VIN2, 11 NC hidden, 12 VOUT2 hidden, 13 VOUT2, 14 VSENS2, 15 PG2, 16 PG1, 17 VSENS1, 18 VOUT1 hidden, 19 VOUT1, 20 NC hidden, 21 PAD

## TPS70248_HTSSOP20
designator *  value TPS70248_HTSSOP20  Reference: U
ki_keywords: Dual 3.3V 1.5V LDO Regulator 500mA 250mA Voltage Supervisor; ki_description: 3.3V 500mA/1.5V 250mA Dual Low Drop-out Regulator with Voltage Supervisor, PowerPAD TSSOP-20; ki_fp_filters: HTSSOP*4.4x6.5mm*P0.65mm*; Footprint: Package_SO:HTSSOP-20-1EP_4.4x6.5mm_P0.65mm_EP3.4x6.5mm_ThermalVias; Datasheet: http://www.ti.com/lit/ds/symlink/tps702.pdf
pins: 1 NC hidden, 2 VIN1 hidden, 3 VIN1, 4 ~{{MR}}, 5 ~{{EN1}}, 6 ~{{EN2}}, 7 ~{{RESET}}, 8 GND, 9 VIN2 hidden, 10 VIN2, 11 NC hidden, 12 VOUT2 hidden, 13 VOUT2, 14 VSENS2, 15 PG2, 16 PG1, 17 VSENS1, 18 VOUT1 hidden, 19 VOUT1, 20 NC hidden, 21 PAD

## TPS70251_HTSSOP20
designator *  value TPS70251_HTSSOP20  Reference: U
ki_keywords: Dual 3.3V 1.8V LDO Regulator 500mA 250mA Voltage Supervisor; ki_description: 3.3V 500mA/1.8V 250mA Dual Low Drop-out Regulator with Voltage Supervisor, PowerPAD TSSOP-20; ki_fp_filters: HTSSOP*4.4x6.5mm*P0.65mm*; Footprint: Package_SO:HTSSOP-20-1EP_4.4x6.5mm_P0.65mm_EP3.4x6.5mm_ThermalVias; Datasheet: http://www.ti.com/lit/ds/symlink/tps702.pdf
pins: 1 NC hidden, 2 VIN1 hidden, 3 VIN1, 4 ~{{MR}}, 5 ~{{EN1}}, 6 ~{{EN2}}, 7 ~{{RESET}}, 8 GND, 9 VIN2 hidden, 10 VIN2, 11 NC hidden, 12 VOUT2 hidden, 13 VOUT2, 14 VSENS2, 15 PG2, 16 PG1, 17 VSENS1, 18 VOUT1 hidden, 19 VOUT1, 20 NC hidden, 21 PAD

## TPS70258_HTSSOP20
designator *  value TPS70258_HTSSOP20  Reference: U
ki_keywords: Dual 3.3V 2.5V LDO Regulator 500mA 250mA Voltage Supervisor; ki_description: 3.3V 500mA/2.5V 250mA Dual Low Drop-out Regulator with Voltage Supervisor, PowerPAD TSSOP-20; ki_fp_filters: HTSSOP*4.4x6.5mm*P0.65mm*; Footprint: Package_SO:HTSSOP-20-1EP_4.4x6.5mm_P0.65mm_EP3.4x6.5mm_ThermalVias; Datasheet: http://www.ti.com/lit/ds/symlink/tps702.pdf
pins: 1 NC hidden, 2 VIN1 hidden, 3 VIN1, 4 ~{{MR}}, 5 ~{{EN1}}, 6 ~{{EN2}}, 7 ~{{RESET}}, 8 GND, 9 VIN2 hidden, 10 VIN2, 11 NC hidden, 12 VOUT2 hidden, 13 VOUT2, 14 VSENS2, 15 PG2, 16 PG1, 17 VSENS1, 18 VOUT1 hidden, 19 VOUT1, 20 NC hidden, 21 PAD

## TPS70302
designator *  value TPS70302  Reference: U
ki_keywords: dual ldo regulator; ki_description: Dual-Output, Low Dropout Voltage Regulators With Integrated SVS For Split Voltage Systems, Sequenced Outputs, ADJ 1A/ADJ 2A, HTSSOP-24; ki_fp_filters: HTSSOP*4.4x7.8mm*P0.65mm*; Footprint: Package_SO:HTSSOP-24-1EP_4.4x7.8mm_P0.65mm_EP3.4x7.8mm_Mask2.4x4.68mm_ThermalVias; Datasheet: http://www.ti.com/lit/ds/symlink/tps703.pdf
pins: 1 GND/HS hidden, 2 VIN1, 3 VIN1 hidden, 4 NC hidden, 5 ~{{MR2}}, 6 ~{{MR1}}, 7 ~{{EN}}, 8 SEQ, 9 GND, 10 VIN2, 11 VIN2 hidden, 12 GND/HS hidden, 13 GND/HS hidden, 14 VOUT2, 15 VOUT2 hidden, 16 VSENSE2/FB2, 17 NC hidden, 18 ~{{RESET}}, 19 PG1, 20 NC hidden, 21 VSENSE1/FB1, 22 VOUT1, 23 VOUT1 hidden, 24 GND/HS hidden, 25 GND/HS

## TPS70345
designator *  value TPS70345  Reference: U
ki_keywords: dual ldo regulator; ki_description: Dual-Output, Low Dropout Voltage Regulators With Integrated SVS For Split Voltage Systems, Sequenced Outputs, 3.3V 1A/1.2V 2A, HTSSOP-24; ki_fp_filters: HTSSOP*4.4x7.8mm*P0.65mm*; Footprint: Package_SO:HTSSOP-24-1EP_4.4x7.8mm_P0.65mm_EP3.4x7.8mm_Mask2.4x4.68mm_ThermalVias; Datasheet: http://www.ti.com/lit/ds/symlink/tps703.pdf
pins: 1 GND/HS hidden, 2 VIN1, 3 VIN1 hidden, 4 NC hidden, 5 ~{{MR2}}, 6 ~{{MR1}}, 7 ~{{EN}}, 8 SEQ, 9 GND, 10 VIN2, 11 VIN2 hidden, 12 GND/HS hidden, 13 GND/HS hidden, 14 VOUT2, 15 VOUT2 hidden, 16 VSENSE2/FB2, 17 NC hidden, 18 ~{{RESET}}, 19 PG1, 20 NC hidden, 21 VSENSE1/FB1, 22 VOUT1, 23 VOUT1 hidden, 24 GND/HS hidden, 25 GND/HS

## TPS70348
designator *  value TPS70348  Reference: U
ki_keywords: dual ldo regulator; ki_description: Dual-Output, Low Dropout Voltage Regulators With Integrated SVS For Split Voltage Systems, Sequenced Outputs, 3.3V 1A/1.5V 2A, HTSSOP-24; ki_fp_filters: HTSSOP*4.4x7.8mm*P0.65mm*; Footprint: Package_SO:HTSSOP-24-1EP_4.4x7.8mm_P0.65mm_EP3.4x7.8mm_Mask2.4x4.68mm_ThermalVias; Datasheet: http://www.ti.com/lit/ds/symlink/tps703.pdf
pins: 1 GND/HS hidden, 2 VIN1, 3 VIN1 hidden, 4 NC hidden, 5 ~{{MR2}}, 6 ~{{MR1}}, 7 ~{{EN}}, 8 SEQ, 9 GND, 10 VIN2, 11 VIN2 hidden, 12 GND/HS hidden, 13 GND/HS hidden, 14 VOUT2, 15 VOUT2 hidden, 16 VSENSE2/FB2, 17 NC hidden, 18 ~{{RESET}}, 19 PG1, 20 NC hidden, 21 VSENSE1/FB1, 22 VOUT1, 23 VOUT1 hidden, 24 GND/HS hidden, 25 GND/HS

## TPS70351
designator *  value TPS70351  Reference: U
ki_keywords: dual ldo regulator; ki_description: Dual-Output, Low Dropout Voltage Regulators With Integrated SVS For Split Voltage Systems, Sequenced Outputs, 3.3V 1A/1.8V 2A, HTSSOP-24; ki_fp_filters: HTSSOP*4.4x7.8mm*P0.65mm*; Footprint: Package_SO:HTSSOP-24-1EP_4.4x7.8mm_P0.65mm_EP3.4x7.8mm_Mask2.4x4.68mm_ThermalVias; Datasheet: http://www.ti.com/lit/ds/symlink/tps703.pdf
pins: 1 GND/HS hidden, 2 VIN1, 3 VIN1 hidden, 4 NC hidden, 5 ~{{MR2}}, 6 ~{{MR1}}, 7 ~{{EN}}, 8 SEQ, 9 GND, 10 VIN2, 11 VIN2 hidden, 12 GND/HS hidden, 13 GND/HS hidden, 14 VOUT2, 15 VOUT2 hidden, 16 VSENSE2/FB2, 17 NC hidden, 18 ~{{RESET}}, 19 PG1, 20 NC hidden, 21 VSENSE1/FB1, 22 VOUT1, 23 VOUT1 hidden, 24 GND/HS hidden, 25 GND/HS